# Altium footprint library PcbLib_ICs.PcbLib: 317 footprints (part 12 of 24) (continued)
## PQFP-100 [mm] "PQFP, 100-Leads, Body 14,00x14,00mm, Pitch 0,50mm, IPC Medium Density" (continued)
  region: -5.113,8 -5.113,7 -4.893,7 -4.893,8
  region: -4.612,8 -4.612,7 -4.392,7 -4.392,8
  region: -4.112,8 -4.112,7 -3.892,7 -3.892,8
  region: 1.888,8 1.888,7 2.108,7 2.108,8
  region: 1.388,8 1.388,7 1.608,7 1.608,8
  region: 0.888,8 0.888,7 1.108,7 1.108,8
  region: 0.388,8 0.388,7 0.608,7 0.608,8
  region: -1.612,8 -1.612,7 -1.392,7 -1.392,8
  region: -1.112,8 -1.112,7 -0.892,7 -0.892,8
  region: -0.612,8 -0.612,7 -0.392,7 -0.392,8
  region: -0.112,8 -0.112,7 0.108,7 0.108,8
  region: 3.888,8 3.888,7 4.108,7 4.108,8
  region: 3.388,8 3.388,7 3.608,7 3.608,8
  region: 2.888,8 2.888,7 3.108,7 3.108,8
  region: 2.388,8 2.388,7 2.608,7 2.608,8
  region: 4.388,8 4.388,7 4.608,7 4.608,8
  region: 4.888,8 4.888,7 5.108,7 5.108,8
  region: 5.388,8 5.388,7 5.608,7 5.608,8
  region: 5.888,8 5.888,7 6.108,7 6.108,8
Top Assy:
  drawing of 1489 lines, arcs and shapes, not listed
  text ".Designator" at -3.443,-0.467 h2
Top Text:
  lines w0.05: -8.7,-8.7 -8.7,8.7 8.7,8.7 8.7,-8.7 -8.7,-8.7
  lines w0.1: -0.5,0 0.5,0 ; 0,-0.5 0,0.5
3D body "LQFP100.STEP": height 1.6, standoff 0, extent -8,-8 8,8

## PQFP-208 [mm] "SQFP, 208-Leads, Body 28.00x28.00mm, Pitch 0.50mm, IPC Medium Density"
height 4.1
pads (208):
  rect 1.55x0.3 smd paste+0 mask+0.05: 1(-14.95,12.75)
  oval 1.55x0.3 smd paste+0 mask+0.05: 2(-14.95,12.25) 3(-14.95,11.75) 4(-14.95,11.25) 5(-14.95,10.75) 6(-14.95,10.25) 7(-14.95,9.75) 8(-14.95,9.25) 9(-14.95,8.75) 10(-14.95,8.25) 11(-14.95,7.75) 12(-14.95,7.25) 13(-14.95,6.75) 14(-14.95,6.25) 15(-14.95,5.75) 16(-14.95,5.25) 17(-14.95,4.75) 18(-14.95,4.25) 19(-14.95,3.75) 20(-14.95,3.25) 21(-14.95,2.75) 22(-14.95,2.25) 23(-14.95,1.75) 24(-14.95,1.25) 25(-14.95,0.75) 26(-14.95,0.25) 27(-14.95,-0.25) 28(-14.95,-0.75) 29(-14.95,-1.25) 30(-14.95,-1.75) 31(-14.95,-2.25) 32(-14.95,-2.75) 33(-14.95,-3.25) 34(-14.95,-3.75) 35(-14.95,-4.25) 36(-14.95,-4.75) 37(-14.95,-5.25) 38(-14.95,-5.75) 39(-14.95,-6.25) 40(-14.95,-6.75) 41(-14.95,-7.25) 42(-14.95,-7.75) 43(-14.95,-8.25) 44(-14.95,-8.75) 45(-14.95,-9.25) 46(-14.95,-9.75) 47(-14.95,-10.25) 48(-14.95,-10.75) 49(-14.95,-11.25) 50(-14.95,-11.75) 51(-14.95,-12.25) 52(-14.95,-12.75) 105(14.95,-12.75) 106(14.95,-12.25) 107(14.95,-11.75) 108(14.95,-11.25) 109(14.95,-10.75) 110(14.95,-10.25) 111(14.95,-9.75) 112(14.95,-9.25) 113(14.95,-8.75) 114(14.95,-8.25) 115(14.95,-7.75) 116(14.95,-7.25) 117(14.95,-6.75) 118(14.95,-6.25) 119(14.95,-5.75) 120(14.95,-5.25) 121(14.95,-4.75) 122(14.95,-4.25) 123(14.95,-3.75) 124(14.95,-3.25) 125(14.95,-2.75) 126(14.95,-2.25) 127(14.95,-1.75) 128(14.95,-1.25) 129(14.95,-0.75) 130(14.95,-0.25) 131(14.95,0.25) 132(14.95,0.75) 133(14.95,1.25) 134(14.95,1.75) 135(14.95,2.25) 136(14.95,2.75) 137(14.95,3.25) 138(14.95,3.75) 139(14.95,4.25) 140(14.95,4.75) 141(14.95,5.25) 142(14.95,5.75) 143(14.95,6.25) 144(14.95,6.75) 145(14.95,7.25) 146(14.95,7.75) 147(14.95,8.25) 148(14.95,8.75) 149(14.95,9.25) 150(14.95,9.75) 151(14.95,10.25) 152(14.95,10.75) 153(14.95,11.25) 154(14.95,11.75) 155(14.95,12.25) 156(14.95,12.75)
  oval 0.3x1.55 smd paste+0 mask+0.05: 53(-12.75,-14.95) 54(-12.25,-14.95) 55(-11.75,-14.95) 56(-11.25,-14.95) 57(-10.75,-14.95) 58(-10.25,-14.95) 59(-9.75,-14.95) 60(-9.25,-14.95) 61(-8.75,-14.95) 62(-8.25,-14.95) 63(-7.75,-14.95) 64(-7.25,-14.95) 65(-6.75,-14.95) 66(-6.25,-14.95) 67(-5.75,-14.95) 68(-5.25,-14.95) 69(-4.75,-14.95) 70(-4.25,-14.95) 71(-3.75,-14.95) 72(-3.25,-14.95) 73(-2.75,-14.95) 74(-2.25,-14.95) 75(-1.75,-14.95) 76(-1.25,-14.95) 77(-0.75,-14.95) 78(-0.25,-14.95) 79(0.25,-14.95) 80(0.75,-14.95) 81(1.25,-14.95) 82(1.75,-14.95) 83(2.25,-14.95) 84(2.75,-14.95) 85(3.25,-14.95) 86(3.75,-14.95) 87(4.25,-14.95) 88(4.75,-14.95) 89(5.25,-14.95) 90(5.75,-14.95) 91(6.25,-14.95) 92(6.75,-14.95) 93(7.25,-14.95) 94(7.75,-14.95) 95(8.25,-14.95) 96(8.75,-14.95) 97(9.25,-14.95) 98(9.75,-14.95) 99(10.25,-14.95) 100(10.75,-14.95) 101(11.25,-14.95) 102(11.75,-14.95) 103(12.25,-14.95) 104(12.75,-14.95) 157(12.75,14.95) 158(12.25,14.95) 159(11.75,14.95) 160(11.25,14.95) 161(10.75,14.95) 162(10.25,14.95) 163(9.75,14.95) 164(9.25,14.95) 165(8.75,14.95) 166(8.25,14.95) 167(7.75,14.95) 168(7.25,14.95) 169(6.75,14.95) 170(6.25,14.95) 171(5.75,14.95) 172(5.25,14.95) 173(4.75,14.95) 174(4.25,14.95) 175(3.75,14.95) 176(3.25,14.95) 177(2.75,14.95) 178(2.25,14.95) 179(1.75,14.95) 180(1.25,14.95) 181(0.75,14.95) 182(0.25,14.95) 183(-0.25,14.95) 184(-0.75,14.95) 185(-1.25,14.95) 186(-1.75,14.95) 187(-2.25,14.95) 188(-2.75,14.95) 189(-3.25,14.95) 190(-3.75,14.95) 191(-4.25,14.95) 192(-4.75,14.95) 193(-5.25,14.95) 194(-5.75,14.95) 195(-6.25,14.95) 196(-6.75,14.95) 197(-7.25,14.95) 198(-7.75,14.95) 199(-8.25,14.95) 200(-8.75,14.95) 201(-9.25,14.95) 202(-9.75,14.95) 203(-10.25,14.95) 204(-10.75,14.95) 205(-11.25,14.95) 206(-11.75,14.95) 207(-12.25,14.95) 208(-12.75,14.95)
Top Overlay:
  circle w0.6: c-12.775,12.775 r0.3
  circle w0.25: c-15.625,13.5 r0.125
  lines w0.2: -17,-12.75 -16,-12.75 ; -17,-6.25 -16,-6.25 ; -17,0.25 -16,0.25 ; -17,6.75 -16,6.75 ; -17,12.75 -16,12.75 ; -14.15,-13.55 -14.15,-14.15 -13.525,-14.15 ; -14.15,13.525 -14.15,14.15 -13.55,14.15 ; -12.75,-17 -12.75,-16 ; -12.75,16 -12.75,17 ; -6.75,-17 -6.75,-16 ; -6.25,16 -6.25,17 ; -0.25,-17 -0.25,-16 ; 0.25,16 0.25,17 ; 6.25,-17 6.25,-16 ; 6.75,16 6.75,17 ; 12.75,-17 12.75,-16 ; 12.75,16 12.75,17 ; 13.525,14.15 14.15,14.15 14.15,13.55 ; 13.55,-14.15 14.15,-14.15 14.15,-13.525 ; 16,-12.75 17,-12.75 ; 16,-6.75 17,-6.75 ; 16,-0.25 17,-0.25 ; 16,6.25 17,6.25 ; 16,12.75 17,12.75
Top Assy:
  drawing of 5622 lines, arcs and shapes, not listed
  text ".Designator" at -3.443,-0.467 h2
Top Text:
  lines w0.05: -15.95,-15.95 15.95,-15.95 15.95,15.95 -15.95,15.95 -15.95,-15.95
  lines w0.1: -0.5,0 0.5,0 ; 0,-0.5 0,0.5
3D body "SQFP50P3060X3060X410-208N.step": height 4.1, standoff 0, extent -15.3,-15.3 15.3,15.3

## PVQFN40 [mm]
pads (41):
  rect 0.28x0.85 smd paste+0 mask+0.05: 1(2.25,2.975)
  oval 0.28x0.85 smd paste+0 mask+0.05: 2(1.75,2.975) 3(1.25,2.975) 4(0.75,2.975) 5(0.25,2.975) 6(-0.25,2.975) 7(-0.75,2.975) 8(-1.25,2.975) 9(-1.75,2.975) 10(-2.25,2.975) 21(-2.25,-2.975) 22(-1.75,-2.975) 23(-1.25,-2.975) 24(-0.75,-2.975) 25(-0.25,-2.975) 26(0.25,-2.975) 27(0.75,-2.975) 28(1.25,-2.975) 29(1.75,-2.975) 30(2.25,-2.975)
  oval 0.85x0.28 smd paste+0 mask+0.05: 11(-2.975,2.25) 12(-2.975,1.75) 13(-2.975,1.25) 14(-2.975,0.75) 15(-2.975,0.25) 16(-2.975,-0.25) 17(-2.975,-0.75) 18(-2.975,-1.25) 19(-2.975,-1.75) 20(-2.975,-2.25) 31(2.975,-2.25) 32(2.975,-1.75) 33(2.975,-1.25) 34(2.975,-0.75) 35(2.975,-0.25) 36(2.975,0.25) 37(2.975,0.75) 38(2.975,1.25) 39(2.975,1.75) 40(2.975,2.25)
  rrect10% 2.62x3.52 smd paste-3 mask+0.05: EP(0,0)
via -1,0 diameter 0.7 hole 0.3
via 1,0 diameter 0.7 hole 0.3
via 1,1 diameter 0.7 hole 0.3
via -1,1 diameter 0.7 hole 0.3
via -1,-1 diameter 0.7 hole 0.3
via 1,-1 diameter 0.7 hole 0.3
via 0,1 diameter 0.7 hole 0.3
via 0,-1 diameter 0.7 hole 0.3
via 0,0 diameter 0.7 hole 0.3
Top Overlay:
  circle w0.25: c3.875,3 r0.125
  lines w0.2: -3.2,-2.785 -3.2,-3.2 -2.785,-3.2 ; -3.2,2.785 -3.2,3.2 -2.785,3.2 ; 2.785,-3.2 3.2,-3.2 3.2,-2.785 ; 2.785,3.2 3.2,3.2 3.2,2.785
Top Paste:
  region: -0.15,1.65 -1.15,1.65 -1.15,0.15 -0.15,0.15
  region: 1.15,1.65 0.15,1.65 0.15,0.15 1.15,0.15
  region: 1.15,-0.15 0.15,-0.15 0.15,-1.65 1.15,-1.65
  region: -0.15,-0.15 -1.15,-0.15 -1.15,-1.65 -0.15,-1.65
Bottom Solder:
  region: -2.2,-2.2 -2.2,-0.4 -1.8,0 -2.2,0.4 -2.2,2.2 -0.4,2.2 0,1.8 0.4,2.2 2.2,2.2 2.2,0.4 1.8,0 2.2,-0.4 2.2,-2.2 0.4,-2.2 0,-1.8 -0.4,-2.2
Top Assy:
  circle w0.05: c2.5,2.5 r0.2
  lines w0.05: -3.087,-2.4 -3.12,-2.4 -3.12,-2.1 -3.087,-2.1 ; -3.087,-1.9 -3.12,-1.9 -3.12,-1.6 -3.087,-1.6 ; -3.087,-1.4 -3.12,-1.4 -3.12,-1.1 -3.087,-1.1 ; -3.087,-0.9 -3.12,-0.9 -3.12,-0.6 -3.087,-0.6 ; -3.087,-0.4 -3.12,-0.4 -3.12,-0.1 -3.087,-0.1 ; -3.087,0.1 -3.12,0.1 -3.12,0.4 -3.087,0.4 ; -3.087,0.6 -3.12,0.6 -3.12,0.9 -3.087,0.9 ; -3.087,1.1 -3.12,1.1 -3.12,1.4 -3.087,1.4 ; -3.087,1.6 -3.12,1.6 -3.12,1.9 -3.087,1.9 ; -3.087,2.1 -3.12,2.1 -3.12,2.4 -3.087,2.4 ; -2.4,-3.087 -2.4,-3.12 -2.1,-3.12 -2.1,-3.087 ; -2.4,3.087 -2.4,3.12 -2.1,3.12 -2.1,3.087 ; -1.9,-3.087 -1.9,-3.12 -1.6,-3.12 -1.6,-3.087 ; -1.9,3.087 -1.9,3.12 -1.6,3.12 -1.6,3.087 ; -1.4,-3.087 -1.4,-3.12 -1.1,-3.12 -1.1,-3.087 ; -1.4,3.087 -1.4,3.12 -1.1,3.12 -1.1,3.087 ; -0.9,-3.087 -0.9,-3.12 -0.6,-3.12 -0.6,-3.087 ; -0.9,3.087 -0.9,3.12 -0.6,3.12 -0.6,3.087 ; -0.4,-3.087 -0.4,-3.12 -0.1,-3.12 -0.1,-3.087 ; -0.4,3.087 -0.4,3.12 -0.1,3.12 -0.1,3.087 ; 0.1,-3.087 0.1,-3.12 0.4,-3.12 0.4,-3.087 ; 0.1,3.087 0.1,3.12 0.4,3.12 0.4,3.087 ; 0.6,-3.087 0.6,-3.12 0.9,-3.12 0.9,-3.087 ; 0.6,3.087 0.6,3.12 0.9,3.12 0.9,3.087 ; 1.1,-3.087 1.1,-3.12 1.4,-3.12 1.4,-3.087 ; 1.1,3.087 1.1,3.12 1.4,3.12 1.4,3.087 ; 1.6,-3.087 1.6,-3.12 1.9,-3.12 1.9,-3.087 ; 1.6,3.087 1.6,3.12 1.9,3.12 1.9,3.087 ; 2.1,-3.087 2.1,-3.12 2.4,-3.12 2.4,-3.087 ; 2.1,3.087 2.1,3.12 2.4,3.12 2.4,3.087 ; 3.087,-2.4 3.12,-2.4 3.12,-2.1 3.087,-2.1 ; 3.087,-1.9 3.12,-1.9 3.12,-1.6 3.087,-1.6 ; 3.087,-1.4 3.12,-1.4 3.12,-1.1 3.087,-1.1 ; 3.087,-0.9 3.12,-0.9 3.12,-0.6 3.087,-0.6 ; 3.087,-0.4 3.12,-0.4 3.12,-0.1 3.087,-0.1 ; 3.087,0.1 3.12,0.1 3.12,0.4 3.087,0.4 ; 3.087,0.6 3.12,0.6 3.12,0.9 3.087,0.9 ; 3.087,1.1 3.12,1.1 3.12,1.4 3.087,1.4 ; 3.087,1.6 3.12,1.6 3.12,1.9 3.087,1.9 ; 3.087,2.1 3.12,2.1 3.12,2.4 3.087,2.4 ; -3.075,-3.075 -3.075,3.075 3.075,3.075 3.075,-3.075 -3.075,-3.075
  text ".Designator" at -3.443,-0.467 h2
Top Text:
  lines w0.1: -0.5,0 0.5,0 ; 0,-0.5 0,0.5
3D body "PVQFN-40-1.STEP": height 1, standoff 0, extent -3.001,-3.001 3.001,3.001

## QFN12 [mm] "QFN, 12-Leads, Body 3.00x3.00mm, Pitch 0.50mm, Thermal Pad 1.30x1.30mm, IPC Medium Density"
height 1
pads (13):
  rect 0.95x0.3 smd paste+0 mask+0.05: 1(-1.375,0.5)
  oval 0.95x0.3 smd paste+0 mask+0.05: 2(-1.375,0) 3(-1.375,-0.5) 7(1.375,-0.5) 8(1.375,0) 9(1.375,0.5)
  oval 0.3x0.95 smd paste+0 mask+0.05: 4(-0.5,-1.375) 5(0,-1.375) 6(0.5,-1.375) 10(0.5,1.375) 11(0,1.375) 12(-0.5,1.375)
  rrect30% 1.3x1.3 smd paste-50 mask+0.05: EP(0,0)
via 0.35,0.35 diameter 0.7 hole 0.3
via -0.35,0.35 diameter 0.7 hole 0.3
via 0.35,-0.35 diameter 0.7 hole 0.3
via -0.35,-0.35 diameter 0.7 hole 0.3
Top Overlay:
  circle w0.25: c-2.225,1.25 r0.125
  lines w0.2: -1.65,-1 -1.65,-1.65 -1,-1.65 ; -1.65,1 -1.65,1.65 -1,1.65 ; 1,-1.65 1.65,-1.65 1.65,-1 ; 1,1.65 1.65,1.65 1.65,1
Top Paste:
  rectangle: 0.1,0.1 0.6,0.6
  rectangle: -0.6,0.1 -0.1,0.6
  rectangle: 0.1,-0.6 0.6,-0.1
  rectangle: -0.6,-0.6 -0.1,-0.1
Bottom Solder:
  region: -1,1 -0.3,1 0,0.7 0.3,1 1,1 1,0.3 0.7,0 1,-0.3 1,-1 0.3,-1 0,-0.7 -0.3,-1 -1,-1 -1,-0.3 -0.7,0 -1,0.3
Top Assy:
  circle w0.05: c-1.1,1.1 r0.125
  lines w0.05: -1.5,-0.625 -1.51,-0.625 -1.51,-0.375 -1.5,-0.375 ; -1.5,-0.125 -1.51,-0.125 -1.51,0.125 -1.5,0.125 ; -1.5,0.375 -1.51,0.375 -1.51,0.625 -1.5,0.625 ; -0.625,-1.5 -0.625,-1.51 -0.375,-1.51 -0.375,-1.5 ; -0.625,1.5 -0.625,1.51 -0.375,1.51 -0.375,1.5 ; -0.125,-1.5 -0.125,-1.51 0.125,-1.51 0.125,-1.5 ; -0.125,1.5 -0.125,1.51 0.125,1.51 0.125,1.5 ; 0.375,-1.5 0.375,-1.51 0.625,-1.51 0.625,-1.5 ; 0.375,1.5 0.375,1.51 0.625,1.51 0.625,1.5 ; 1.5,-0.625 1.51,-0.625 1.51,-0.375 1.5,-0.375 ; 1.5,-0.125 1.51,-0.125 1.51,0.125 1.5,0.125 ; 1.5,0.375 1.51,0.375 1.51,0.625 1.5,0.625 ; -1.5,-1.5 1.5,-1.5 1.5,1.5 -1.5,1.5 -1.5,-1.5
  text ".Designator" at -2.579,-0.349 h1.5
Top Text:
  lines w0.05: -2.1,-2.1 -2.1,2.1 2.1,2.1 2.1,-2.1 -2.1,-2.1
  lines w0.1: -0.5,0 0.5,0 ; 0,-0.5 0,0.5
3D body "SW3dPS-qfn12p300x300ll055ls050h075.STEP": height 0.75, standoff 0, extent -1.5,-1.5 1.5,1.5

## QFN16 [mm]
pads (17):
  rect 0.8x0.3 smd paste+0 mask+0.05: 1(-1.5,0.75)
  oval 0.8x0.3 smd paste+0 mask+0.05: 2(-1.5,0.25) 3(-1.5,-0.25) 4(-1.5,-0.75) 9(1.5,-0.75) 10(1.5,-0.25) 11(1.5,0.25) 12(1.5,0.75)
  oval 0.3x0.8 smd paste+0 mask+0.05: 5(-0.75,-1.5) 6(-0.25,-1.5) 7(0.25,-1.5) 8(0.75,-1.5) 13(0.75,1.5) 14(0.25,1.5) 15(-0.25,1.5) 16(-0.75,1.5)
  rrect30% 1.8x1.8 smd paste-50 mask+0.05: EP(0,0)
via 0.4,0.4 diameter 0.7 hole 0.3
via -0.4,0.4 diameter 0.7 hole 0.3
via 0.4,-0.4 diameter 0.7 hole 0.3
via -0.4,-0.4 diameter 0.7 hole 0.3
Top Overlay:
  circle w0.25: c-2.125,1.375 r0.125
  lines w0.2: -1.625,-1.125 -1.625,-1.625 -1.125,-1.625 ; -1.625,1.125 -1.625,1.625 -1.125,1.625 ; 1.125,-1.625 1.625,-1.625 1.625,-1.125 ; 1.125,1.625 1.625,1.625 1.625,1.125
Top Paste:
  rectangle: -0.25,-0.25 0.25,0.25
  rectangle: -0.95,-0.25 -0.45,0.25
  rectangle: -0.25,-0.95 0.25,-0.45
  rectangle: -0.95,-0.95 -0.45,-0.45
  rectangle: 0.45,-0.25 0.95,0.25
  rectangle: 0.45,-0.95 0.95,-0.45
  region: 0.95,0.45 0.95,0.95 0.45,0.95 0.45,0.45
  region: 0.25,0.45 0.25,0.95 -0.25,0.95 -0.25,0.45
  region: -0.45,0.45 -0.45,0.95 -0.95,0.95 -0.95,0.45
Bottom Solder:
  region: -1,1 -0.3,1 0,0.7 0.3,1 1,1 1,0.3 0.7,0 1,-0.3 1,-1 0.3,-1 0,-0.7 -0.3,-1 -1,-1 -1,-0.3 -0.7,0 -1,0.3
Top Assy:
  circle w0.05: c-1,1 r0.2
  lines w0.05: -1.5,-0.875 -1.521,-0.875 -1.521,-0.625 -1.5,-0.625 ; -1.5,-0.375 -1.521,-0.375 -1.521,-0.125 -1.5,-0.125 ; -1.5,0.125 -1.521,0.125 -1.521,0.375 -1.5,0.375 ; -1.5,0.625 -1.521,0.625 -1.521,0.875 -1.5,0.875 ; -0.875,-1.5 -0.875,-1.521 -0.625,-1.521 -0.625,-1.5 ; -0.875,1.5 -0.875,1.521 -0.625,1.521 -0.625,1.5 ; -0.375,-1.5 -0.375,-1.521 -0.125,-1.521 -0.125,-1.5 ; -0.375,1.5 -0.375,1.521 -0.125,1.521 -0.125,1.5 ; 0.125,-1.5 0.125,-1.521 0.375,-1.521 0.375,-1.5 ; 0.125,1.5 0.125,1.521 0.375,1.521 0.375,1.5 ; 0.625,-1.5 0.625,-1.521 0.875,-1.521 0.875,-1.5 ; 0.625,1.5 0.625,1.521 0.875,1.521 0.875,1.5 ; 1.5,-0.875 1.521,-0.875 1.521,-0.625 1.5,-0.625 ; 1.5,-0.375 1.521,-0.375 1.521,-0.125 1.5,-0.125 ; 1.5,0.125 1.521,0.125 1.521,0.375 1.5,0.375 ; 1.5,0.625 1.521,0.625 1.521,0.875 1.5,0.875 ; -1.5,-1.5 -1.5,1.5 1.5,1.5 1.5,-1.5 -1.5,-1.5
  text ".Designator" at -2.579,-0.349 h1.5
Top Text:
  lines w0.1: -0.5,0 0.5,0 ; 0,-0.5 0,0.5
3D body "QFN16-3X3MM_1_1_V03.STEP": height 0.95, standoff -0.03, extent -1.58,-1.585 1.58,1.575

## QFN16_LTC5564 [mm] "QFN-16, 3mm x 3mm, pitch 0.5mm. Reference LTC DWG # 05-08-1691 Rev Ø"
pads (17):
  rect 0.7x0.25 smd paste+0 mask+0.05: 1(-1.4,0.75)
  oval 0.7x0.25 smd paste+0 mask+0.05: 2(-1.4,0.25) 3(-1.4,-0.25) 4(-1.4,-0.75) 9(1.4,-0.75) 10(1.4,-0.25) 11(1.4,0.25) 12(1.4,0.75)
  oval 0.25x0.7 smd paste+0 mask+0.05: 5(-0.75,-1.4) 6(-0.25,-1.4) 7(0.25,-1.4) 8(0.75,-1.4) 13(0.75,1.4) 14(0.25,1.4) 15(-0.25,1.4) 16(-0.75,1.4)
  rrect10% 1.5x1.5 smd paste-50 mask+0.05: EP(0,0)
via -0.4,-0.4 diameter 0.7 hole 0.3
via 0.4,-0.4 diameter 0.7 hole 0.3
via -0.4,0.4 diameter 0.7 hole 0.3
via 0.4,0.4 diameter 0.7 hole 0.3
Top Overlay:
  circle w0.25: c-2.125,1.375 r0.125
  lines w0.2: -1.625,-1.125 -1.625,-1.625 -1.125,-1.625 ; -1.625,1.125 -1.625,1.625 -1.125,1.625 ; 1.125,-1.625 1.625,-1.625 1.625,-1.125 ; 1.125,1.625 1.625,1.625 1.625,1.125
Top Paste:
  region: -0.1,0.1 -0.1,0.6 -0.6,0.6 -0.6,0.1
  region: 0.6,0.1 0.6,0.6 0.1,0.6 0.1,0.1
  rectangle: -0.6,-0.6 -0.1,-0.1
  rectangle: 0.1,-0.6 0.6,-0.1
Bottom Solder:
  region: -0.9,0.9 -0.2,0.9 0,0.7 0.2,0.9 0.9,0.9 0.9,0.2 0.7,0 0.9,-0.2 0.9,-0.9 0.2,-0.9 0,-0.7 -0.2,-0.9 -0.9,-0.9 -0.9,-0.2 -0.7,0 -0.9,0.2
Top Assy:
  circle w0.05: c-1,1 r0.2
  lines w0.05: -1.5,-0.875 -1.521,-0.875 -1.521,-0.625 -1.5,-0.625 ; -1.5,-0.375 -1.521,-0.375 -1.521,-0.125 -1.5,-0.125 ; -1.5,0.125 -1.521,0.125 -1.521,0.375 -1.5,0.375 ; -1.5,0.625 -1.521,0.625 -1.521,0.875 -1.5,0.875 ; -0.875,-1.5 -0.875,-1.521 -0.625,-1.521 -0.625,-1.5 ; -0.875,1.5 -0.875,1.521 -0.625,1.521 -0.625,1.5 ; -0.375,-1.5 -0.375,-1.521 -0.125,-1.521 -0.125,-1.5 ; -0.375,1.5 -0.375,1.521 -0.125,1.521 -0.125,1.5 ; 0.125,-1.5 0.125,-1.521 0.375,-1.521 0.375,-1.5 ; 0.125,1.5 0.125,1.521 0.375,1.521 0.375,1.5 ; 0.625,-1.5 0.625,-1.521 0.875,-1.521 0.875,-1.5 ; 0.625,1.5 0.625,1.521 0.875,1.521 0.875,1.5 ; 1.5,-0.875 1.521,-0.875 1.521,-0.625 1.5,-0.625 ; 1.5,-0.375 1.521,-0.375 1.521,-0.125 1.5,-0.125 ; 1.5,0.125 1.521,0.125 1.521,0.375 1.5,0.375 ; 1.5,0.625 1.521,0.625 1.521,0.875 1.5,0.875 ; -1.5,-1.5 1.5,-1.5 1.5,1.5 -1.5,1.5 -1.5,-1.5
  text ".Designator" at -2.579,-0.349 h1.5
Top Text:
  lines w0.1: -0.5,0 0.5,0 ; 0,-0.5 0,0.5
3D body "QFN-16_LTC5564.STEP": height 0.75, standoff 0, extent -1.525,-1.525 1.525,1.525

## QFN16_RGT0016C [mm]
pads (17):
  rect 0.6x0.24 smd paste+0 mask+0.05: 1(-1.4,0.75)
  oval 0.6x0.24 smd paste+0 mask+0.05: 2(-1.4,0.25) 3(-1.4,-0.25) 4(-1.4,-0.75) 9(1.4,-0.75) 10(1.4,-0.25) 11(1.4,0.25) 12(1.4,0.75)
  oval 0.24x0.6 smd paste+0 mask+0.05: 5(-0.75,-1.4) 6(-0.25,-1.4) 7(0.25,-1.4) 8(0.75,-1.4) 13(0.75,1.4) 14(0.25,1.4) 15(-0.25,1.4) 16(-0.75,1.4)
  rrect10% 1.68x1.68 smd paste-50 mask+0.05: EP(0,0)
via -0.4,-0.4 diameter 0.7 hole 0.3
via 0.4,-0.4 diameter 0.7 hole 0.3
via -0.4,0.4 diameter 0.7 hole 0.3
via 0.4,0.4 diameter 0.7 hole 0.3
Top Overlay:
  circle w0.25: c-2.125,1.375 r0.125
  lines w0.2: -1.625,-1.125 -1.625,-1.625 -1.125,-1.625 ; -1.625,1.125 -1.625,1.625 -1.125,1.625 ; 1.125,-1.625 1.625,-1.625 1.625,-1.125 ; 1.125,1.625 1.625,1.625 1.625,1.125
Top Paste:
  rectangle: 0.1,-0.6 0.6,-0.1
  rectangle: 0.1,0.1 0.6,0.6
  rectangle: -0.6,-0.6 -0.1,-0.1
  rectangle: -0.6,0.1 -0.1,0.6
Bottom Solder:
  region: -1,1 -0.3,1 0,0.7 0.3,1 1,1 1,0.3 0.7,0 1,-0.3 1,-1 0.3,-1 0,-0.7 -0.3,-1 -1,-1 -1,-0.3 -0.7,0 -1,0.3
Top Assy:
  circle w0.05: c-1,1 r0.2
  lines w0.05: -1.5,-0.875 -1.521,-0.875 -1.521,-0.625 -1.5,-0.625 ; -1.5,-0.375 -1.521,-0.375 -1.521,-0.125 -1.5,-0.125 ; -1.5,0.125 -1.521,0.125 -1.521,0.375 -1.5,0.375 ; -1.5,0.625 -1.521,0.625 -1.521,0.875 -1.5,0.875 ; -0.875,-1.5 -0.875,-1.521 -0.625,-1.521 -0.625,-1.5 ; -0.875,1.5 -0.875,1.521 -0.625,1.521 -0.625,1.5 ; -0.375,-1.5 -0.375,-1.521 -0.125,-1.521 -0.125,-1.5 ; -0.375,1.5 -0.375,1.521 -0.125,1.521 -0.125,1.5 ; 0.125,-1.5 0.125,-1.521 0.375,-1.521 0.375,-1.5 ; 0.125,1.5 0.125,1.521 0.375,1.521 0.375,1.5 ; 0.625,-1.5 0.625,-1.521 0.875,-1.521 0.875,-1.5 ; 0.625,1.5 0.625,1.521 0.875,1.521 0.875,1.5 ; 1.5,-0.875 1.521,-0.875 1.521,-0.625 1.5,-0.625 ; 1.5,-0.375 1.521,-0.375 1.521,-0.125 1.5,-0.125 ; 1.5,0.125 1.521,0.125 1.521,0.375 1.5,0.375 ; 1.5,0.625 1.521,0.625 1.521,0.875 1.5,0.875 ; -1.5,-1.5 1.5,-1.5 1.5,1.5 -1.5,1.5 -1.5,-1.5
  text ".Designator" at -2.579,-0.349 h1.5
Top Text:
  lines w0.1: -0.5,0 0.5,0 ; 0,-0.5 0,0.5
3D body "User Library-QFN-16_3x3.STEP": height 0.9, standoff 0, extent -1.519,-1.521 1.523,1.521

## QFN16W_RT8012A [mm] "W-Type 16L QFN 4x4 Package, pitch 0.65mm"
pads (17):
  rect 0.9x0.4 smd paste+0 mask+0.05: 1(-1.9,0.975)
  rrect50% 0.9x0.4 smd paste+0 mask+0.05: 2(-1.9,0.325) 3(-1.9,-0.325) 4(-1.9,-0.975) 9(1.9,-0.975) 10(1.9,-0.325) 11(1.9,0.325) 12(1.9,0.975)
  rrect50% 0.4x0.9 smd paste+0 mask+0.05: 5(-0.975,-1.9) 6(-0.325,-1.9) 7(0.325,-1.9) 8(0.975,-1.9) 13(0.975,1.9) 14(0.325,1.9) 15(-0.325,1.9) 16(-0.975,1.9)
  rrect10% 2.5x2.5 smd paste-50 mask+0.05: EP(0,0)
via -0.75,-0.75 diameter 0.7 hole 0.3
via 0,0 diameter 0.7 hole 0.3
via 0.75,-0.75 diameter 0.7 hole 0.3
via 0.75,0.75 diameter 0.7 hole 0.3
via -0.75,0.75 diameter 0.7 hole 0.3
Top Overlay:
  circle w0.25: c-2.625,1.875 r0.125
  lines w0.2: -2.125,-1.625 -2.125,-2.125 -1.625,-2.125 ; -2.125,1.625 -2.125,2.125 -1.625,2.125 ; 1.625,-2.125 2.125,-2.125 2.125,-1.625 ; 1.625,2.125 2.125,2.125 2.125,1.625
Top Paste:
  rectangle: -0.25,-0.25 0.25,0.25
  rectangle: -0.95,-0.25 -0.45,0.25
  rectangle: -0.25,-0.95 0.25,-0.45
  rectangle: -0.95,-0.95 -0.45,-0.45
  rectangle: 0.45,-0.25 0.95,0.25
  rectangle: 0.45,-0.95 0.95,-0.45
  region: 0.95,0.45 0.95,0.95 0.45,0.95 0.45,0.45
  region: 0.25,0.45 0.25,0.95 -0.25,0.95 -0.25,0.45
  region: -0.45,0.45 -0.45,0.95 -0.95,0.95 -0.95,0.45
Bottom Solder:
  region: -1.35,1.35 -0.2,1.35 0,1.15 0.2,1.35 1.35,1.35 1.35,0.2 1.15,0 1.35,-0.2 1.35,-1.35 0.2,-1.35 0,-1.15 -0.2,-1.35 -1.35,-1.35 -1.35,-0.2 -1.15,0 -1.35,0.2
Top Assy:
  circle w0.05: c-1.6,1.6 r0.25
  lines w0.05: -2,-1.132 -2.025,-1.132 -2.025,-0.818 -2,-0.818 ; -2,-0.483 -2.025,-0.483 -2.025,-0.168 -2,-0.168 ; -2,0.168 -2.025,0.168 -2.025,0.482 -2,0.482 ; -2,0.817 -2.025,0.817 -2.025,1.132 -2,1.132 ; -1.132,-2 -1.132,-2.025 -0.817,-2.025 -0.817,-2 ; -1.132,2 -1.132,2.025 -0.817,2.025 -0.817,2 ; -0.482,-2 -0.482,-2.025 -0.167,-2.025 -0.167,-2 ; -0.482,2 -0.482,2.025 -0.167,2.025 -0.167,2 ; 0.168,-2 0.168,-2.025 0.483,-2.025 0.483,-2 ; 0.168,2 0.168,2.025 0.483,2.025 0.483,2 ; 0.818,-2 0.818,-2.025 1.133,-2.025 1.133,-2 ; 0.818,2 0.818,2.025 1.133,2.025 1.133,2 ; 2,-1.132 2.025,-1.132 2.025,-0.818 2,-0.818 ; 2,-0.483 2.025,-0.483 2.025,-0.168 2,-0.168 ; 2,0.168 2.025,0.168 2.025,0.482 2,0.482 ; 2,0.817 2.025,0.817 2.025,1.132 2,1.132 ; -2,-2 -2,2 2,2 2,-2 -2,-2
  text ".Designator" at -2.579,-0.349 h1.5
Top Text:
  lines w0.1: -0.5,0 0.5,0 ; 0,-0.5 0,0.5
3D body "QFN-16WL.STEP": height 0.8, standoff 0, extent -2.025,-2.025 2.025,2.025

## QFN20 [mm] "PQFN, 20-Leads, Body 5.00x5.35mm, Pitch 0.65mm, Thermal Pad 3.15x3.15mm, IPC Medium Density"
height 1
pads (21):
  rect 1x0.4 smd paste+0 mask+0.05: 1(-2.4,1.3)
  oval 1x0.4 smd paste+0 mask+0.05: 2(-2.4,0.65) 3(-2.4,0) 4(-2.4,-0.65) 5(-2.4,-1.3) 11(2.4,-1.3) 12(2.4,-0.65) 13(2.4,0) 14(2.4,0.65) 15(2.4,1.3)
  oval 0.4x1 smd paste+0 mask+0.05: 6(-1.3,-2.4) 7(-0.65,-2.4) 8(0,-2.4) 9(0.65,-2.4) 10(1.3,-2.4) 16(1.3,2.4) 17(0.65,2.4) 18(0,2.4) 19(-0.65,2.4) 20(-1.3,2.4)
  rrect10% 3.15x3.15 smd paste-50 mask+0.05: EP(0,0)
via 0,-0.75 diameter 0.7 hole 0.3
via 0.75,0 diameter 0.7 hole 0.3
via 0,0.75 diameter 0.7 hole 0.3
via -0.75,0 diameter 0.7 hole 0.3
via -0.75,-0.75 diameter 0.7 hole 0.3
via 0.75,-0.75 diameter 0.7 hole 0.3
via 0.75,0.75 diameter 0.7 hole 0.3
via -0.75,0.75 diameter 0.7 hole 0.3
via 0,0 diameter 0.7 hole 0.3
Top Overlay:
  circle w0.25: c-3.125,2.1 r0.125
  lines w0.2: -2.575,-1.9 -2.575,-2.6 -1.9,-2.6 ; -2.575,1.9 -2.575,2.6 -1.9,2.6 ; 1.9,-2.6 2.575,-2.6 2.575,-1.9 ; 1.9,2.6 2.575,2.6 2.575,1.9
Top Paste:
  rectangle: 0.9,-1.5 1.5,-0.9
  rectangle: -1.5,-1.5 -0.9,-0.9
  rectangle: -0.7,-1.5 -0.1,-0.9
  rectangle: 0.1,-1.5 0.7,-0.9
  region: -0.9,1.5 -1.5,1.5 -1.5,0.9 -0.9,0.9
  region: 1.5,1.5 0.9,1.5 0.9,0.9 1.5,0.9
  region: 0.7,1.5 0.1,1.5 0.1,0.9 0.7,0.9
  region: -0.1,1.5 -0.7,1.5 -0.7,0.9 -0.1,0.9
  region: -0.9,0.7 -1.5,0.7 -1.5,0.1 -0.9,0.1
  region: 1.5,0.7 0.9,0.7 0.9,0.1 1.5,0.1
  region: 0.7,0.7 0.1,0.7 0.1,0.1 0.7,0.1
  region: -0.1,0.7 -0.7,0.7 -0.7,0.1 -0.1,0.1
  rectangle: 0.9,-0.7 1.5,-0.1
  rectangle: -1.5,-0.7 -0.9,-0.1
  rectangle: -0.7,-0.7 -0.1,-0.1
  rectangle: 0.1,-0.7 0.7,-0.1
Bottom Solder:
  region: -1.75,1.75 -0.5,1.75 0,1.25 0.5,1.75 1.75,1.749 1.75,0.5 1.25,0 1.75,-0.5 1.75,-1.75 0.5,-1.75 0,-1.25 -0.5,-1.75 -1.75,-1.75 -1.75,-0.5 -1.25,0 -1.75,0.5
Top Assy:
  circle w0.05: c-2,2 r0.2
  lines w0.05: -2.6,-1.425 -2.6,-1.175 ; -2.6,-0.775 -2.6,-0.525 ; -2.6,-0.125 -2.6,0.125 ; -2.6,0.525 -2.6,0.775 ; -2.6,1.175 -2.6,1.425 ; -1.425,-2.6 -1.175,-2.6 ; -1.425,2.6 -1.175,2.6 ; -0.775,-2.6 -0.525,-2.6 ; -0.775,2.6 -0.525,2.6 ; -0.125,-2.6 0.125,-2.6 ; -0.125,2.6 0.125,2.6 ; 0.525,-2.6 0.775,-2.6 ; 0.525,2.6 0.775,2.6 ; 1.175,-2.6 1.425,-2.6 ; 1.175,2.6 1.425,2.6 ; 2.6,-1.425 2.6,-1.175 ; 2.6,-0.775 2.6,-0.525 ; 2.6,-0.125 2.6,0.125 ; 2.6,0.525 2.6,0.775 ; 2.6,1.175 2.6,1.425 ; -2.575,-2.575 2.575,-2.575 2.575,2.575 -2.575,2.575 -2.575,-2.575
  text ".Designator" at -3.443,-0.467 h2
Top Text:
  lines w0.05: -2.825,-3.175 -2.825,3.175 2.825,3.175 2.825,-3.175 -2.825,-3.175
  lines w0.1: -0.5,0 0.5,0 ; 0,-0.5 0,0.5
3D body "QFN-20 5x5x0_9mm.STEP": height 0.91, standoff 0.01, extent -2.51,-2.51 2.51,2.51

## QFN20_UCS2114 [mm] "QFN-20_3X3 Pitch 0.5mm for UCS2114"
height 0.85
pads (20):
  rect 0.45x0.25 smd paste+0 mask+0.075: 1(-1.625,1) 5(-1.625,-1) 11(1.625,-1) 15(1.625,1)
  rect 0.65x0.25 smd paste+0 mask+0.075: 2(-1.525,0.5) 3(-1.525,0) 4(-1.525,-0.5) 12(1.525,-0.5) 13(1.525,0) 14(1.525,0.5)
  rect 0.25x0.45 smd paste+0 mask+0.075: 6(-1,-1.625) 10(1,-1.625) 16(1,1.625) 20(-1,1.625)
  rect 0.25x0.65 smd paste+0 mask+0.075: 7(-0.5,-1.525) 8(0,-1.525) 9(0.5,-1.525) 17(0.5,1.525) 18(0,1.525) 19(-0.5,1.525)
via 0.6,0.138 diameter 0.55 hole 0.25
via 0.6,0.7 diameter 0.55 hole 0.25
via 0,0.7 diameter 0.55 hole 0.25
via 0,0.138 diameter 0.55 hole 0.25
via -0.6,0.138 diameter 0.55 hole 0.25
via -0.6,0.7 diameter 0.55 hole 0.25
Top Layer:
  region: 1.125,-1.29 1.035,-1.2 0.875,-1.2 0.875,-1.45 1.125,-1.45
  region: 1.315,-1.125 1.2,-1.01 1.2,-0.875 1.45,-0.875 1.45,-1.125
  region: -1.125,-1.29 -1.035,-1.2 -0.875,-1.2 -0.875,-1.45 -1.125,-1.45
  region: -1.315,-1.125 -1.2,-1.01 -1.2,-0.875 -1.45,-0.875 -1.45,-1.125
  region: -1.3,1.125 -1.2,1.025 -1.2,0.875 -1.45,0.875 -1.45,1.125
  region: 1.3,1.125 1.2,1.025 1.2,0.875 1.45,0.875 1.45,1.125
  region: 1.125,1.3 1.025,1.2 0.875,1.2 0.875,1.45 1.125,1.45
  region: -1.125,1.3 -1.025,1.2 -0.875,1.2 -0.875,1.45 -1.125,1.45
  region: 0.375,1.275 0.375,0.975 -0.975,0.975 -0.975,-0.175 0.975,-0.175 0.975,0.975 0.625,0.975 0.625,1.275
  pour cut-out: -1,1 1,1 1,-1 -1,-1
Top Overlay:
  circle w0.25: c-2.25,1.5 r0.125
  lines w0.2: -1.7,-1.425 -1.7,-1.7 -1.425,-1.7 ; -1.7,1.425 -1.7,1.7 -1.425,1.7 ; 1.425,-1.7 1.7,-1.7 1.7,-1.425 ; 1.425,1.7 1.7,1.7 1.7,1.425
Top Paste:
  region: 0.25,0.25 -0.25,0.25 -0.25,-0.25 0.25,-0.25
  region: 0.95,0.25 0.45,0.25 0.45,-0.25 0.95,-0.25
  rectangle: -0.95,-0.25 -0.45,0.25
  region: 0.25,0.95 -0.25,0.95 -0.25,0.45 0.25,0.45
  region: 0.95,0.95 0.45,0.95 0.45,0.45 0.95,0.45
  rectangle: -0.95,0.45 -0.45,0.95
Top Assy:
  circle w0.05: c-1.25,1.25 r0.202
  lines w0.05: -1.55,-1.55 -1.55,1.55 1.55,1.55 1.55,-1.55 -1.55,-1.55
  text ".Designator" at -2.404,-0.326 h1.4
Top Text:
  lines w0.1: -0.5,0 0.5,0 ; 0,-0.5 0,0.5
3D body "QFN50P300X300X85-20L.step": height 0.85, standoff 0, extent -1.55,-1.55 1.55,1.55